# Altium footprint library CONNECTORS.PcbLib: 55 footprints (part 3 of 4)
Each footprint in its own frame and in the unit in brackets; x right, y up, seen from the top. Pads: shape width x height; smd on the part's side, far side on the other; paste and mask are expansions set on the pad; w line width, h text height; cw(c..) or ccw(c..) is an arc to the next point about the centre after c.
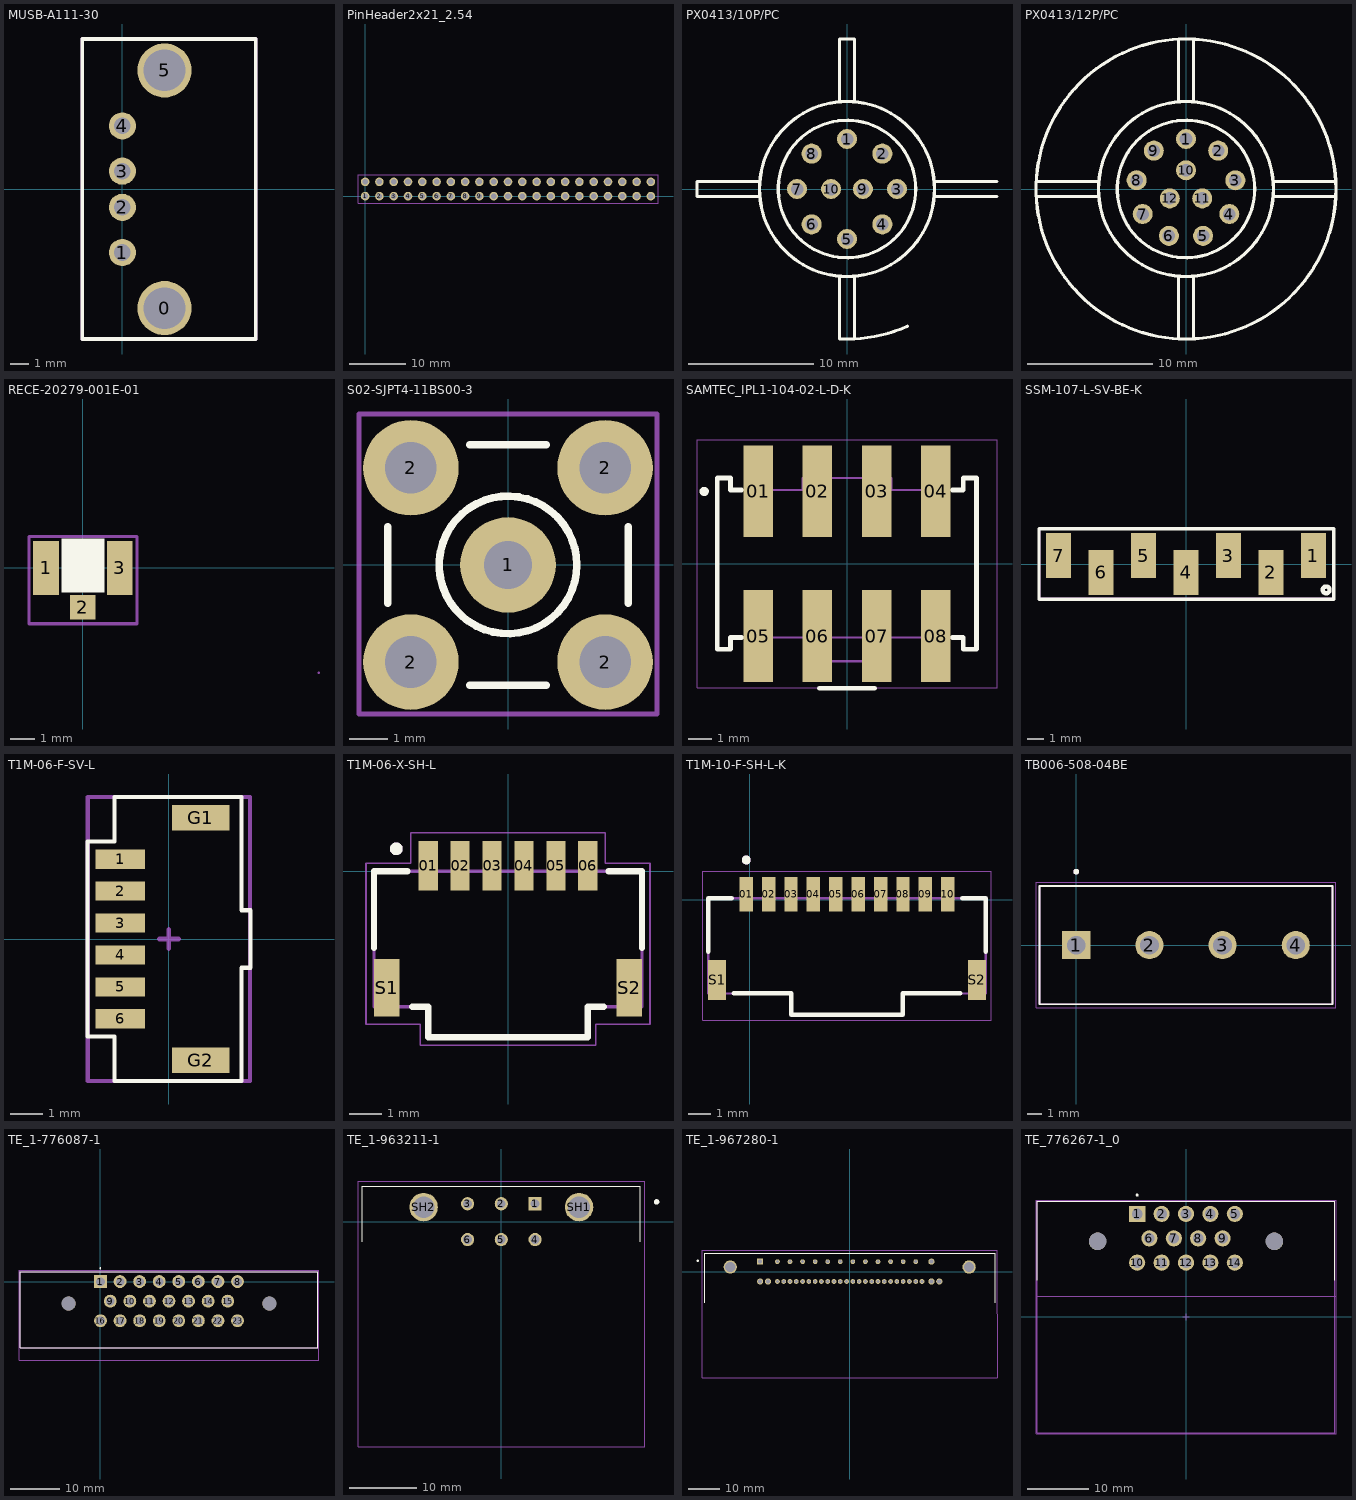
[diagram p2: the footprints below, top view; thin cyan lines are the x and y axes]

## MUSB-A111-30 [mm]
pads (6):
  round 3 hole 2.3: 0(2.33,-6.57) 5(2.33,6.57)
  round 1.5 hole 0.92: 1(0,-3.5) 2(0,-1) 3(0,1) 4(0,3.5)
Top Overlay:
  lines w0.2: -2.21,-8.28 7.366,-8.28 7.366,8.306 -2.21,8.306 -2.21,-8.28
Top Assembly:
  lines w0.2: -2.21,-8.28 -2.21,8.306 7.366,8.306 7.366,-8.28 -2.21,-8.28
  text ".Designator" at 4.9,-4.4 h1.5
3D body "MUSB-A111-M0.STEP": height 13.7, standoff -4.3, extent -2.234,-15.025 13.966,14.975

## PinHeader2x21_2.54 [mil]
pads (42):
  round 60 hole 39.37: 1(0,0) 2(100,0) 3(200,0) 4(300,0) 5(400,0) 6(500,0) 7(600,0) 8(700,0) 9(800,0) 10(900,0) 11(1000,0) 12(1100,0) 13(1200,0) 14(1300,0) 15(1400,0) 16(1500,0) 17(1600,0) 18(1700,0) 19(1800,0) 20(1900,0) 21(2000,0) 22(2000,100) 23(1900,100) 24(1800,100) 25(1700,100) 26(1600,100) 27(1500,100) 28(1400,100) 29(1300,100) 30(1200,100) 31(1100,100) 32(1000,100) 33(900,100) 34(800,100) 35(700,100) 36(600,100) 37(500,100) 38(400,100) 39(300,100) 40(200,100) 41(100,100) 42(0,100)
Top Assembly:
  lines w7.87: -50,-50 2050,-50 2050,150 -50,150 -50,-50

## PX0413/10P/PC [mm]
pads (10):
  round 1.6 hole 1: 1(0,4) 2(2.828,2.828) 3(4,0) 4(2.828,-2.828) 5(0,-4) 6(-2.828,-2.828) 7(-4,0) 8(-2.828,2.828) 9(1.275,0) 10(-1.275,0)
Top Overlay:
  circle w0.254: c0,0 r7
  circle w0.254: c0,0 r5.5
  lines w0.254: -7.1,-0.6 -12,-0.6 -12,0.6 -7.1,0.6 ; -0.6,-7.1 -0.6,-12 0.6,-12 0.6,-7.1 ; -0.573,-11.986 ccw(c0,0) 4.846,-10.978 ; -0.5,7 -0.6,7.1 -0.6,12 0.6,12 0.6,7.1 0.5,7 ; 7.1,-0.6 12,-0.6 ; 7.1,0.6 12,0.6
3D body "px0413-10p-pc.stp": height 21, standoff -3.37, extent -12.832,-12 12.832,12

## PX0413/12P/PC [mm] "CONN RCPT 12POS W/PINS PCB MOUNT"
height 0.533
pads (12):
  round 1.6 hole 1: 1(0,4) 2(2.575,3.069) 3(3.95,0.696) 4(3.464,-2) 5(1.365,-3.75) 6(-1.365,-3.75) 7(-3.464,-2) 8(-3.95,0.7) 9(-2.575,3.069) 10(0,1.5) 11(1.299,-0.75) 12(-1.299,-0.75)
Top Overlay:
  circle w0.254: c0,0 r5.5
  circle w0.254: c0,0 r12
  circle w0.254: c0,0 r7
  lines w0.254: -7.1,-0.6 -12,-0.6 -12,0.6 -7.1,0.6 ; -0.6,-7.1 -0.6,-12 0.6,-12 0.6,-7.1 ; -0.5,7 -0.6,7.1 -0.6,12 0.6,12 0.6,7.1 0.5,7 ; 7.1,-0.6 12,-0.6 12,0.6 7.1,0.6
3D body "px0413-12p-pc.stp": height 20.95, standoff -3.42, extent -12.832,-12 12.832,12

## RECE-20279-001E-01 [mm]
pads (3):
  rect 1.05x2.2 smd: 1(-1.5,0) 3(1.5,0)
  rect 1.05x1 smd: 2(0,-1.6)
Top Overlay:
  region: -0.875,1.2 -0.875,-1 0.875,-1 0.875,1.2
Top Assembly:
  lines w0.127: -2.2,-2.275 -2.2,1.275 2.2,1.275 2.2,-2.275 -2.2,-2.275
  text ".Designator" at -1.75,-1 h1
Top Component Center:
  lines w0.15: -0.298,0 0.302,0 ; 0.002,-0.3 0.002,0.3
Mechanical 13:
  lines w0.1: 9.608,-4.266 9.615,-4.259
3D body "RECE-20279-001E-01.STEP": height 1.25, standoff 0, extent -1.5,-1.55 1.5,1.55

## S02-SJPT4-11BS00-3 [mm]
pads (5):
  round 2.5 hole 1.25: 1(0,0)
  round 2.5 hole 1.35: 2(-2.54,-2.54) 2(-2.54,2.54) 2(2.54,-2.54) 2(2.54,2.54)
Top Overlay:
  circle w0.2: c0,0 r1.8
  lines w0.2: -3.15,-1 -3.15,1 ; -1,-3.15 1,-3.15 ; -1,3.15 1,3.15 ; 3.15,-1 3.15,1
Mechanical 1:
  circle w0.025: c0,0 r0.2
  circle w0.025: c0,0 r1.05
  circle w0.025: c0,0 r1.8
Top Assembly:
  lines w0.127: -3.9,-3.9 -3.9,3.95 3.9,3.95 3.9,-3.9 -3.9,-3.9
  text ".Designator" at -2.375,-0.525 h1.27
3D body "S02-SJPT4-11BS00-3.stp": height 17.7, standoff -3.82, extent -3.5,-3.5 3.5,3.5

## SAMTEC_IPL1-104-02-L-D-K [mm] "Mini-Power Terminal Strip HDR 8 POS 2.54mm Solder SMD"
height 9
pads (8):
  rect 1.27x3.94 smd: 01(-3.81,3.11) 02(-1.27,3.11) 03(1.27,3.11) 04(3.81,3.11) 05(-3.81,-3.11) 06(-1.27,-3.11) 07(1.27,-3.11) 08(3.81,-3.11)
Top Overlay:
  circle w0.2: c-6.142,3.11 r0.1
  lines w0.2: -4.537,-3.175 -5.012,-3.175 -5.012,-3.685 -5.582,-3.685 -5.582,3.685 -5.012,3.685 -5.012,3.175 -4.537,3.175 ; -1.2,-5.352 1.2,-5.352 ; 4.525,-3.175 5,-3.175 5,-3.685 5.57,-3.685 5.57,3.685 5,3.685 5,3.175 4.525,3.175
Mechanical 13:
  lines w0.1: -5,-3.175 -1.27,-3.175 ; -5,3.175 -1.905,3.175 -1.905,3.685 1.905,3.685 1.905,3.175 5,3.175 5,3.685 5.57,3.685 5.57,-3.685 5,-3.685 5,-3.175 1.27,-3.175 ; -1.27,-3.175 1.27,-3.175 ; -1.27,-3.175 -1.27,-4.195 1.27,-4.195 1.27,-3.175
Mechanical 15:
  lines w0.05: -6.452,-5.33 -6.452,5.33 6.452,5.33 6.452,-5.33 -6.452,-5.33
3D body "IPL1-104-02-L-D-K-TR.stp": height 8.75, standoff -0.14, extent -5.842,-4.775 5.842,4.801

## SSM-107-L-SV-BE-K [mm] "1 ROW, 7 POSITION, 0.100 PITCH, SOKET SMT"
height 7.5
pads (7):
  rect 1.5x2.7 smd: 1(7.62,0.5) 2(5.08,-0.5) 3(2.54,0.5) 4(0,-0.5) 5(-2.54,0.5) 6(-5.08,-0.5) 7(-7.62,0.5)
Top Overlay:
  circle w0.254: c8.382,-1.549 r0.205
  lines w0.2: -8.788,-2.1 8.839,-2.1 8.839,2.1 -8.771,2.1 -8.788,2.083 -8.788,-2.1
Top Assembly:
  lines w0.127: -8.771,-2.057 8.839,-2.057 8.839,2.1 -8.771,2.1 -8.771,-2.057
  text ".Designator" at -6.718,-1.058 h1.27
3D body: height 7.5, standoff 0, extent -8.788,-1.168 8.839,1.321
3D body: height 0.3, standoff 0, extent -2.997,1.321 -2.108,1.727
3D body: height 0.3, standoff 0, extent -5.537,-1.575 -4.648,-1.168
3D body: height 0.3, standoff 0, extent -8.077,1.321 -7.188,1.727
3D body: height 0.3, standoff 0, extent -0.457,-1.575 0.432,-1.168
3D body: height 0.3, standoff 0, extent 2.096,1.321 2.985,1.727
3D body: height 0.3, standoff 0, extent 4.623,-1.575 5.512,-1.168

## T1M-06-F-SV-L [mm]
pads (8):
  rect 1.55x0.6 smd mask+0.05: 1(-1.524,2.5) 2(-1.524,1.5) 3(-1.524,0.5) 4(-1.524,-0.5) 5(-1.524,-1.5) 6(-1.524,-2.5)
  rect 1.8x0.8 smd mask+0.05: G1(1.001,3.8) G2(1.001,-3.8)
Top Overlay:
  lines w0.127: -2.544,-3.05 -1.699,-3.05 -1.699,-4.45 2.276,-4.45 2.276,-0.9 2.556,-0.9 2.556,0.9 2.276,0.9 2.276,4.45 -1.699,4.45 -1.699,3.05 -2.544,3.05 -2.544,-3.05
Top Assembly:
  lines w0.127: -2.54,-4.445 2.54,-4.445 2.54,4.445 -2.54,4.445 -2.54,-4.445
  text ".Designator" at -0.127,1.905 h1
Top Component Center:
  lines w0.15: -0.3,-0.002 0.3,-0.002 ; 0,-0.302 0,0.298
3D body "T1M-06-F-SV-L.stp": height 5.2, standoff -0.3, extent -2.125,-4.2 2.825,4.2

## T1M-06-X-SH-L [mm]
pads (8):
  rect 0.6x1.55 smd: 01(-2.5,0.175) 02(-1.5,0.175) 03(-0.5,0.175) 04(0.5,0.175) 05(1.5,0.175) 06(2.5,0.175)
  rect 0.8x1.8 smd: S1(-3.8,-3.65) S2(3.8,-3.65)
Top Overlay:
  circle w0.2: c-3.5,0.7 r0.1
  lines w0.2: -4.2,-2.4 -4.2,0 -3.15,0 ; -3,-4.25 -2.5,-4.25 -2.5,-5.2 2.5,-5.2 2.5,-4.25 3,-4.25 ; 3.15,0 4.2,0 4.2,-2.4
Mechanical 13:
  circle w0.2: c-3.5,0.7 r0.1
  lines w0.1: -4.2,-4.25 -2.5,-4.25 -2.5,-5.2 2.5,-5.2 2.5,-4.25 4.2,-4.25 4.2,0 -4.2,0 -4.2,-4.25
Mechanical 15:
  lines w0.05: -4.45,-4.8 -2.75,-4.8 -2.75,-5.45 2.75,-5.45 2.75,-4.8 4.45,-4.8 4.45,0.25 3.05,0.25 3.05,1.2 -3.05,1.2 -3.05,0.25 -4.45,0.25 -4.45,-4.8
3D body "T1M-06-F-SH-L-K.stp": height 4.75, standoff 0.03, extent -4.2,-5.2 4.2,0.7

## T1M-10-F-SH-L-K [mm] "CONN HEADER SMD R/A 10POS 1MM"
pads (12):
  rect 0.6x1.55 smd: 01(-0.159,0.239) 02(0.841,0.239) 03(1.841,0.239) 04(2.841,0.239) 05(3.841,0.239) 06(4.841,0.239) 07(5.841,0.239) 08(6.841,0.239) 09(7.841,0.239) 10(8.841,0.239)
  rect 0.8x1.8 smd: S1(-1.459,-3.586) S2(10.141,-3.586)
Top Overlay:
  circle w0.2: c-0.159,1.774 r0.1
  lines w0.2: -1.859,-2.336 -1.859,0.064 -0.809,0.064 ; -0.709,-4.186 1.841,-4.186 1.841,-5.136 6.841,-5.136 6.841,-4.186 9.391,-4.186 ; 9.491,0.064 10.541,0.064 10.541,-2.336
Mechanical 13:
  circle w0.2: c-0.159,1.774 r0.1
  lines w0.1: -1.859,-4.186 1.841,-4.186 1.841,-5.136 6.841,-5.136 6.841,-4.186 10.541,-4.186 10.541,0.064 -1.859,0.064 -1.859,-4.186
Mechanical 15:
  lines w0.05: -2.109,-5.386 10.791,-5.386 10.791,1.264 -2.109,1.264 -2.109,-5.386
3D body "T1M-10-F-SH-L-K.stp": height 4.75, standoff 0.03, extent -1.8,-5.2 10.6,0.7

## TB006-508-04BE [mm] "4 POS, TERMINAL BLOCK, SCREW TYPE, 5.08"
pads (4):
  rect 1.95x1.95 hole 1.3: 1(0,0)
  round 1.95 hole 1.3: 2(5.08,0) 3(10.16,0) 4(15.24,0)
Top Overlay:
  circle w0.2: c0,5.1 r0.1
  lines w0.127: -2.54,-4.1 -2.54,4.1 17.78,4.1 17.78,-4.1 -2.54,-4.1
Mechanical 13:
  circle w0.2: c0,5.1 r0.1
  lines w0.127: -2.54,-4.1 -2.54,4.1 17.78,4.1 17.78,-4.1 -2.54,-4.1
Mechanical 15:
  lines w0.05: -2.79,-4.35 18.03,-4.35 18.03,4.35 -2.79,4.35 -2.79,-4.35
3D body "TB006-508-04BE.step": height 10, standoff -3.8, extent -2.535,-4.2 18.285,4

## TE_1-776087-1 [mm]
pads (25):
  rect 2.625x2.625 hole 1.75: 1(0,0)
  round 2.625 hole 1.75: 2(4,0) 3(8,0) 4(12,0) 5(16,0) 6(20,0) 7(24,0) 8(28,0) 9(2,-4) 10(6,-4) 11(10,-4) 12(14,-4) 13(18,-4) 14(22,-4) 15(26,-4) 16(0,-8) 17(4,-8) 18(8,-8) 19(12,-8) 20(16,-8) 21(20,-8) 22(24,-8) 23(28,-8)
  round 2.85 hole 2.85 unplated: ""(-6.5,-4.5) ""(34.5,-4.5)
Top Overlay:
  circle w0.2: c0,2.7 r0.1
  lines w0.127: -16.4,-13.49 44.4,-13.49 44.4,2.05 -16.4,2.05 -16.4,-13.49
Mechanical 13:
  lines w0.127: -16.4,-13.5 -16.4,2.05 44.4,2.05 44.4,-13.5 -16.4,-13.5
Mechanical 15:
  lines w0.05: -16.65,-16.05 44.65,-16.05 44.65,2.3 -16.65,2.3 -16.65,-16.05
3D body "1-776087-1.stp": height 27.8, standoff -4.3, extent -16.41,-35.8 44.39,2
3D body: height 0.25, standoff 0, extent 0,0 0,0

## TE_1-963211-1 [mm] "Connector Header Through Hole, Right Angle 6 position 0.197\" (5.00mm)"
pads (8):
  rect 1.95x1.95 hole 1.3: 1(5,2.65)
  round 1.95 hole 1.3: 2(0,2.65) 3(-5,2.65) 4(5,-2.65) 5(0,-2.65) 6(-5,-2.65)
  round 4.216 hole 3.2: SH1(11.5,2.15) SH2(-11.5,2.15)
Top Overlay:
  circle w0.4: c22.987,2.921 r0.2
  lines w0.127: -20.574,-3 -20.574,5.269 20.574,5.269 20.574,-3
Mechanical 13:
  lines w0.127: -21.209,-33.291 -21.209,5.952 21.209,5.952 21.209,-33.291 -21.209,-33.291
3D body "1-963211-1.STEP": height 26.81, standoff -3.09, extent -20.018,-31.962 19.982,4.638
3D body: height 0.25, standoff 0, extent -4.619,12.302 -4.619,12.302

## TE_1-967280-1 [mm] "Connector Header Through Hole, Right Angle 42 position 0.197\" (5.00mm)"
pads (44):
  rect 1.95x1.95 hole 1.3: 1(-28.5,3.15)
  round 1.508 hole 1: 2(-23,3.15) 3(-19,3.15) 4(-15,3.15) 5(-11,3.15) 6(-7,3.15) 7(-3,3.15) 8(1,3.15) 9(5,3.15) 10(9,3.15) 11(13,3.15) 12(17,3.15) 13(21,3.15) 16(-21,-3.15) 17(-17,-3.15) 18(-13,-3.15) 19(-9,-3.15) 20(-5,-3.15) 21(-1,-3.15) 22(3,-3.15) 23(7,-3.15) 24(11,-3.15) 25(15,-3.15) 26(19,-3.15) 27(23,-3.15) 30(-23,-3.15) 31(-19,-3.15) 32(-15,-3.15) 33(-11,-3.15) 34(-7,-3.15) 35(-3,-3.15) 36(1,-3.15) 37(5,-3.15) 38(9,-3.15) 39(13,-3.15) 40(17,-3.15) 41(21,-3.15)
  round 1.95 hole 1.3: 14(26,3.15) 15(-26,-3.15) 28(28.5,-3.15) 29(-28.5,-3.15) 42(26,-3.15)
  round 4.216 hole 3.2: SH1(-38,1.45) SH2(38,1.45)
Top Overlay:
  circle w0.4: c-48.387,3.454 r0.2
  lines w0.127: -46.259,-10 -46.259,5.819 46.259,5.819 46.259,-10
Mechanical 13:
  lines w0.254: -46.863,-33.757 -46.863,6.756 46.863,6.756 46.863,-33.757 -46.863,-33.757
3D body "1-967280-1.STEP": height 32.51, standoff -3.09, extent -46,-32.03 46,5.07
3D body: height 0.25, standoff 0, extent 0.381,6.502 0.381,6.502

## TE_776267-1_0 [mm]
pads (16):
  rect 2.65x2.65 hole 1.75 paste-1000 mask+0: 1(-8,16.9)
  round 2.65 hole 1.75 paste-1000 mask+0: 2(-4,16.9) 3(0,16.9) 4(4,16.9) 5(8,16.9) 6(-6,12.9) 7(-2,12.9) 8(2,12.9) 9(6,12.9) 10(-8,8.9) 11(-4,8.9) 12(0,8.9) 13(4,8.9) 14(8,8.9)
  round 2.85 hole 2.85 unplated paste-1000 mask+0: ""(-14.5,12.4) ""(14.5,12.4)
Top Overlay:
  circle w0.25: c-8,20 r0.125
  lines w0.2: -24.4,6 -24.4,18.95 24.4,18.95 24.4,6
Mechanical 10:
  lines w0.2: -24.6,-19.15 24.6,-19.15 24.6,19.15 -24.6,19.15 -24.6,-19.15
  text ".Designator" at 0,0 h1
Mechanical 12:
  lines w0.15: -24.6,3.4 24.6,3.4 ; -24.4,-18.95 24.4,-18.95 24.4,18.95 -24.4,18.95 -24.4,-18.95
Mechanical 15:
  lines w0.1: -0.5,0 0.5,0 ; 0,-0.5 0,0.5
  lines w0.2: -24.6,-19.15 24.6,-19.15 24.6,19.15 -24.6,19.15 -24.6,-19.15
3D body "3dmodel.step": height 0.25, standoff 0, extent -24.6,-19.15 24.6,19.15